# Altium integrated library CbyP.IntLib: 1144 symbols (part 4 of 6) (continued)
## MOC3063S-TA1
designator MOC?
1000V/us 1A 20mA 600V 1.4V SMD-6P Triac, SCR Output Optoisolators RoHS; Manufacturer: LITEON; Mfr.Part #: MOC3063S-TA1; Package: SMD-6P; LCSC Part #: C77950; DigiKey Part Number: 160-1723-2-ND; ComponentLink1Description: Link; ComponentLink1URL: https://www.lcsc.com/product-detail/C77950.html?s_z=n_moc3063; ComponentLink2Description: Link 1; ComponentLink2URL: https://www.digikey.com/en/products/detail/liteon/MOC3063S-TA1/670015
footprint SMD-6P
pins: 1 ANODE, 2 CATHODE, 4 MAIN_TERMINAL1, 6 MAIN_TERMINAL2
text: ZERO

## MOC3063SM
designator MOC?
600V/us 100mA 60mA 1.3V 600V SMD-6P Triac, SCR Output Optoisolators RoHS; Manufacturer: onsemi; Mfr.Part #: MOC3063SM; Package: SMD-6P; LCSC Part #: C899841; DigiKey Part Number: MOC3063SM-ND; ComponentLink1Description: Link; ComponentLink1URL: https://www.lcsc.com/product-detail/C899841.html?s_z=n_MOC3063; ComponentLink2Description: Link 1; ComponentLink2URL: https://www.digikey.com/en/products/detail/onsemi/MOC3063SM/401990
footprint SMD-6P
pins: 1 ANODE, 2 CATHODE, 4 MAIN_TERMINAL1, 6 MAIN_TERMINAL2
text: ZERO

## MS2A40LWS
designator D?, comment JU4
DIODE SCHOTTKY 40V SOD-323; Manufacturer: MSKSEMI; Mfr.Part #: MS2A40LWS; Package: SOD-323; LCSC Part #: C7380001
footprint SOD-323
pins: 1 A, 2 K

## NFMW486AM-V2
designator LED?, comment WHITE
5050 replacement pkg, High efficiency and high flux; Manufacturer: NICHIA; Mfr.Part #: NFMW486AM-V2; Package: SMD,5.8x6.5x0.8mm; LCSC Part #: NO; DigiKey Part Number: NO; ComponentLink1Description: Link; ComponentLink1URL: https://led-ld.nichia.co.jp/en/product/led_product_data.html?type=NFMW486AM-V2+%28Ra+Typ.70%29&kbn=0
footprint NFMW486AM-V2
pins: 1 A, 2 K

## NVD5117PLT4G-VF01
designator Q?, comment NVD5117PL
60V 61A 16mΩ@10V,61A 118W 1.5V 1 piece P-channel DPAK MOSFETs ROHS; Manufacturer: onsemi; Mfr.Part #: NVD5117PLT4G-VF01; Package: DPAK; LCSC Part #: C604532
footprint TO-252
pins: 1 G, 2 D, 3 S

## PC357A
designator Q?
OPTOISOLATOR 3.75kV 1CH TRANS SOP-4-208mil-2.54mm; Manufacturer: AOTE; Package: SOP-4-2.54mm; Mfr.Part #: PC357A; LCSC Part #: C22384609
footprint SOP-4-2.54mm
pins: 1 A, 2 K, 3 E, 4 C

## PC817C
designator Q?, comment PC817
Phototransistor Output 5kVrms 1 Channel SMD-4P; Manufacturer: GOODWORK; Mfr.Part #: PC817C; LCSC Part #: C3025164; Package: SMD-4P; DigiKey Part Number: NO; ComponentLink1Description: Link; ComponentLink1URL: https://www.lcsc.com/product-detail/C3025164.html?s_z=n_C3025164; ComponentLink2Description: Link 1
footprint SOP-4
pins: 1 A, 2 K, 3 E, 4 C

## PC817C-S
designator Q?, comment PC817
Phototransistor Output 5kVrms 1 Channel SOP-4-2.54mm; Manufacturer: UMW; Mfr.Part #: PC817C-S; Package: SOP-4-2.54mm; LCSC Part #: C3008369; DigiKey Part Number: NO; ComponentLink1Description: Link; ComponentLink1URL: https://www.lcsc.com/product-detail/C3008369.html?s_z=n_C3008369; ComponentLink2Description: Link 1
footprint SOP-4
pins: 1 A, 2 K, 3 E, 4 C

## PESD3V3L5UY,115
designator ESD?, comment ESD3.3V
12VC Clamp 2.5A@8/20us Ipp ESD DIODE SOT-363; Manufacturer: Nexperia; Mfr.Part #: PESD3V3L5UY,115; So_Chan_Cam: 0; Package: SOT-363; LCSC Part #: C477992; DigiKey Part Number: 1727-3828-2-ND; ComponentLink1Description: Link; ComponentLink1URL: https://www.lcsc.com/product-detail/C477992.html?s_z=n_PESD3V3L5UY%252C115; ComponentLink2Description: Link 1; ComponentLink2URL: https://www.digikey.com/en/products/detail/nexperia-usa-inc/PESD3V3L5UY-115/1157444?s=N4IgTCBcDaIAoFEDKARAzANTQGQKwFUBNAGgEZTcQBdAXyA
footprint SOT-363
pins: 1 C, 2 A, 3 C, 4 C, 5 C, 6 C

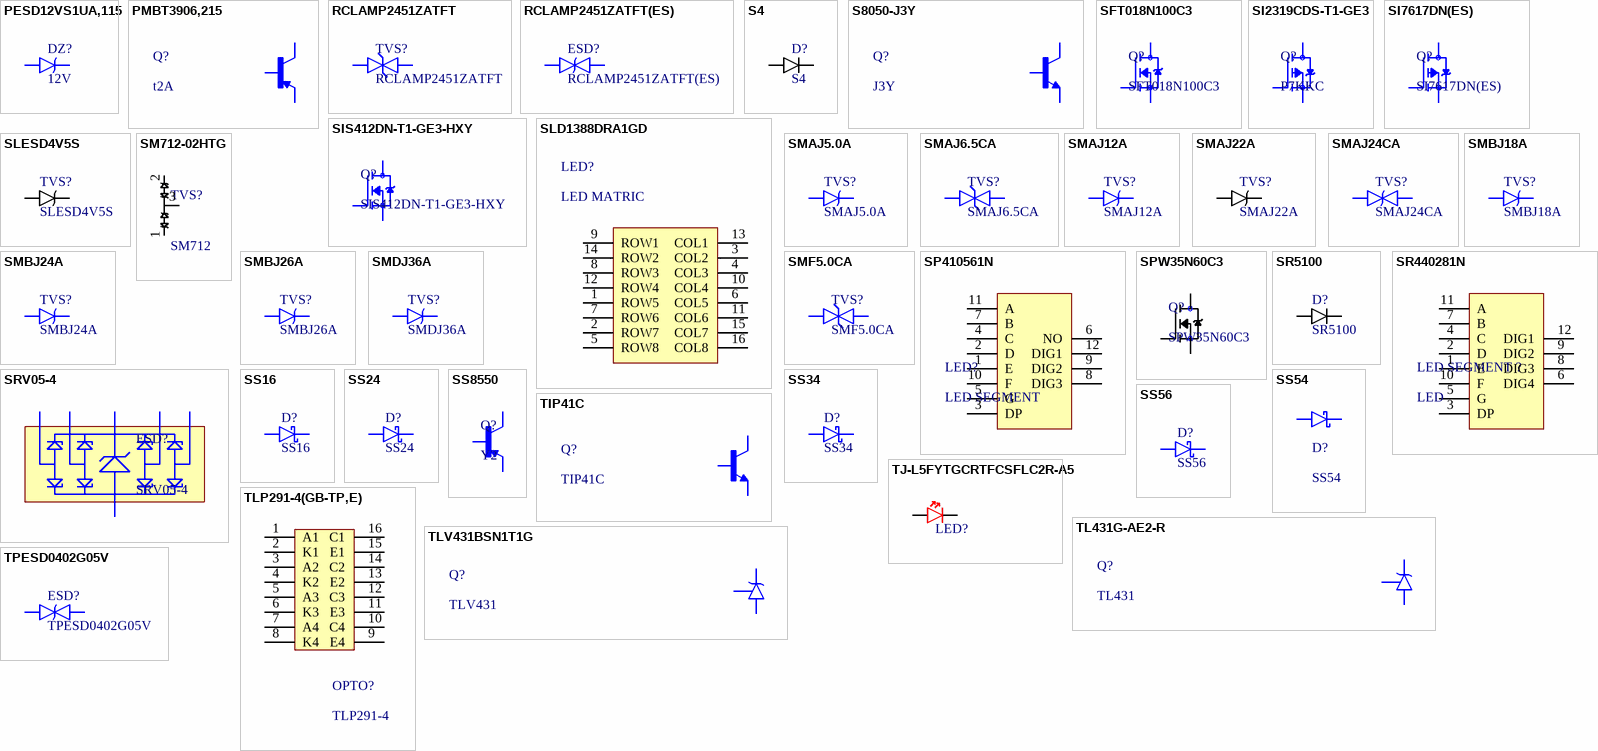
[diagram p21: symbols PESD12VS1UA,115 to TPESD0402G05V]

## PESD12VS1UA,115
designator DZ?, comment 12V
ESD DIODE 12VWM 27VC SOD-323; Manufacturer: Nexperia; Mfr.Part #: PESD12VS1UA,115; Package: SOD-323; LCSC Part #: C131084
footprint SOD-323
pins: 1 A, 2 K

## PMBT3906,215
designator Q?, comment t2A
Bipolar (BJT) Transistor PNP 40V 200mA 250MHz 250mW Surface Mount SOT-23; Manufacturer: Nexperia; Mfr.Part #: PMBT3906,215; LCSC Part #: C8670; Package: SOT-23; DigiKey Part Number: 1727-2960-2-ND; ComponentLink1Description: Link; ComponentLink1URL: https://www.lcsc.com/product-detail/C8670.html?s_z=n_PMBT3906; ComponentLink2Description: Link 1; ComponentLink2URL: https://www.digikey.com/en/products/detail/nexperia-usa-inc/PMBT3906-215/763346
footprint SOT-23
pins: 1 B, 2 E, 3 C

## RCLAMP2451ZATFT
designator TVS?
TVS DIODE 24VWM 8VC 0201; Manufacturer: SEMTECH; Mfr.Part #: RCLAMP2451ZATFT; Package: 0201; LCSC Part #: C1975086
footprint SOD-123
pins: 1, 2

## RCLAMP2451ZATFT(ES)
designator ESD?
ESD DIODE 24VWM 5.6VC DFN0603-2L; Manufacturer: ElecSuper; Mfr.Part #: RCLAMP2451ZATFT(ES); Package: DFN0603-2L; LCSC Part #: C42400636
footprint DFN0603-2L
pins: 1 A, 2 K

## S4
designator D?
40V Single 350mA 600mV@200mA SOD-123 Schottky Barrier Diodes (SBD) ROHS; Manufacturer: HXY MOSFET; Mfr.Part #: 1N5819W; So_Chan_Dan: 2; So_Chan_Cam: 0; Package: SOD-123; Name: 1N5819W
footprint SOD-123
pins: 1 A, 2 K

## S8050-J3Y
designator Q?, comment J3Y
Bipolar (BJT) Transistor NPN 25V 300mA 150MHz 300mW Surface Mount SOT-23; Manufacturer: JSMSEMI; Mfr.Part #: S8050-J3Y; LCSC Part #: C18221467; Package: SOT-23; DigiKey Part Number: NO
footprint SOT-23
pins: 1 B, 2 E, 3 C

## SFT018N100C3
designator Q?
N-Channel 100V 320A 312W Surface Mount TOLL; Manufacturer: SCILICON; Package: TOLL; Mfr.Part #: SFT018N100C3; LCSC Part #: C42395330; DigiKey Part Number: NO; ComponentLink1Description: Link; ComponentLink1URL: https://www.lcsc.com/product-detail/C42395330.html?s_z=n_c42395330; ComponentLink2Description: Link 1
footprint TOLL
pins: 1 G, 2 S, 3 D

## SI2319CDS-T1-GE3
designator Q?, comment P7KKC
P-Channel 40V 4.4A 2.5W Surface Mount SOT-23; Manufacturer: VISHAY; Mfr.Part #: SI2319CDS-T1-GE3; Package: SOT-23; LCSC Part #: C146287; DigiKey Part Number: SI2319CDS-T1-GE3TR-ND; ComponentLink1Description: Link; ComponentLink1URL: https://www.lcsc.com/product-detail/C146287.html?s_z=n_Si2319; ComponentLink2Description: Link 1; ComponentLink2URL: https://www.digikey.com/en/products/detail/vishay-siliconix/SI2319CDS-T1-GE3/2441585?s=N4IgTCBcDaIMoEkwGYCMBOAwgETgWgBVU8BxAUWRAF0BfIA
footprint SOT-23
pins: 1 G, 2 S, 3 D

## SI7617DN(ES)
designator Q?
MOSFET P-CH 30V 39A PDFN-8L(3x3); Manufacturer: ElecSuper; Package: PDFN-8L(3x3); Mfr.Part #: SI7617DN(ES); LCSC Part #: C42412335
footprint PDFN-8L(3x3)
pins: 1 G, 2 S, 3 S, 4 S, 5 D, 6 D, 7 D, 8 D, 9 D

## SIS412DN-T1-GE3-HXY
designator Q?
MOSFET N-CH 30V 20A DFN-8L(3x3); Manufacturer: HXY MOSFET; Package: DFN-8L(3x3); Mfr.Part #: SIS412DN-T1-GE3-HXY; LCSC Part #: C22366922
footprint PDFN-8L(3x3)
pins: 1 S, 2 S, 3 S, 4 G, 5 D, 6 D, 7 D, 8 D, 9 D

## SLD1388DRA1GD
designator LED?, comment LED MATRIC
Common Anode 8x8 Red Plugin LED Dot Matrix and Cluster ROHS; Manufacturer: SUNLIGHT; Mfr.Part #: SLD1388DRA1GD; Package: Through Hole; LCSC Part #: C2913075; DigiKey Part Number: NO
footprint LED MATRIX 8X8DOT 32X32MM
pins: 1 ROW5, 2 ROW7, 3 COL2, 4 COL3, 5 ROW8, 6 COL5, 7 ROW6, 8 ROW3, 9 ROW1, 10 COL4, 11 COL6, 12 ROW4, 13 COL1, 14 ROW2, 15 COL7, 16 COL8

## SLESD4V5S
designator TVS?
1.26kW 5V Unidirectional 4.5V SOD-323 ESD and Surge Protection (TVS/ESD) ROHS; Manufacturer: Slkor(SLKORMICRO Elec.); So_Chan_Dan: 2; So_Chan_Cam: 0; Mfr.Part #: SLESD4V5S; Package: SOD-323; Name: SLESD4V5S
footprint SOD-323
pins: 1 A, 2 K

## SM712-02HTG
designator TVS?, comment SM712
19A@8/20us 600W@8/20us Bidirectional SOT-23 ESD and Surge Protection (TVS/ESD) ROHS; Manufacturer: Littelfuse; Mfr.Part #: SM712-02HTG; Package: SOT-23; LCSC Part #: C172881
footprint SOT-23
pins: 1 C, 2, 3 A

## SMAJ5.0A
designator TVS?
TVS DIODE 5VWM 9.2VC DO-214AC(SMA); Manufacturer: Littelfuse; Mfr.Part #: SMAJ5.0A; Package: DO-214AC(SMA); LCSC Part #: C83329
footprint SMA(DO-214AC) - 2
pins: 1 A, 2 K

## SMAJ6.5CA
designator TVS?
35.7A 400W 11.2V 7.22V 6.5V SMA(DO-214AC) ESD and Surge Protection (TVS/ESD) ROHS; Manufacturer: GOODWORK; Mfr.Part #: SMAJ6.5CA; Package: SMA(DO-214AC); LCSC Part #: C908811; DigiKey Part Number: NO
footprint SMA(DO-214AC)-1
pins: 1, 2

## SMAJ12A
designator TVS?
TVS DIODE 12VWM 19.9VC DO-214AC(SMA); Manufacturer: GOODWORK; Mfr.Part #: SMAJ12A; Package: DO-214AC(SMA); LCSC Part #: C908766
footprint SMA(DO-214AC) - 2
pins: 1 A, 2 K

## SMAJ22A
designator TVS?
11.3A 35.5V 400W 24.4V Unidirectional 22V SMA ESD and Surge Protection (TVS/ESD) ROHS; Manufacturer: PAKER; So_Chan_Dan: 2; So_Chan_Cam: 0; Mfr.Part #: SMAJ22A; Package: SMA; Name: SMAJ22A
footprint SMA(DO-214AC)
pins: 1 A, 2 K

## SMAJ24CA
designator TVS?
10.3A 400W@10/1000us 38.9V 29.5V Bidirectional 24V DO-214AC(SMA) TVS Diodes RoHS; Manufacturer: Littelfuse; Mfr.Part #: SMAJ24CA; Package: SMA(DO-214AC); LCSC Part #: C148223; DigiKey Part Number: SMAJ24CALFTR-ND
footprint SMA(DO-214AC)
footprint SMA(DO-214AC)-1
pins: 1 A, 2 K

## SMBJ18A
designator TVS?
TVS DIODE 18VWM 29.2VC DO-214AA; Manufacturer: Littelfuse; Mfr.Part #: SMBJ18A; Package: DO-214AA; LCSC Part #: C151256
footprint SMB(DO-214AA)
footprint SMB(DO-214AA) - 1
pins: 1 A, 2 K

## SMBJ24A
designator TVS?
TVS DIODE 24VWM 38.9VC DO-214AA(SMB); Manufacturer: GOODWORK; Mfr.Part #: SMBJ24A; Package: DO-214AA(SMB); LCSC Part #: C908801
footprint SMB(DO-214AA)
footprint SMB(DO-214AA) - 1
pins: 1 A, 2 K

## SMBJ26A
designator TVS?
TVS DIODE 26VWM 42.1VC DO-214AA; Manufacturer: Littelfuse; Mfr.Part #: SMBJ26A; Package: DO-214AA; LCSC Part #: C315992
footprint SMB(DO-214AA)
pins: 1 A, 2 K

## SMDJ36A
designator TVS?
51.6A 58.1V 3kW 40V Unidirectional 36V SMC ESD and Surge Protection (TVS/ESD) ROHS; Manufacturer: SETsafe | SETfuse; Mfr.Part #: SMDJ36A; Package: SMC; Name: SMDJ36A
footprint SMC
pins: 1 A, 2 K

## SMF5.0CA
designator TVS?
TVS DIODE 5VWM 9.2VC SOD-123FL; Manufacturer: JSMSEMI; Mfr.Part #: SMF5.0CA; Package: SOD-123FL; LCSC Part #: C2857315; DigiKey Part Number: NO
footprint SOD-123
pins: 1, 2

## SP410561N
designator LED?, comment LED SEGMENT
Display Modules - LED Character and Numeric Red 3 Character Common Anode Through Hole; Manufacturer: ARKLED; Mfr.Part #: SP410561N; Package: Through Hole; LCSC Part #: C98924; DigiKey Part Number: NO; ComponentLink1Description: Link; ComponentLink1URL: https://www.lcsc.com/product-detail/C98924.html?s_z=n_q_C98924&globalKeyword=C98924; ComponentLink2Description: Link
footprint LED SEGMENT 3 POSITIONS 0.56INCH
pins: 1 E, 2 D, 3 DP, 4 C, 5 G, 6 NO, 7 B, 8 DIG3, 9 DIG2, 10 F, 11 A, 12 DIG1

## SPW35N60C3
designator Q?
TO-247AC-3 MOSFETs ROHS; Manufacturer: Infineon Technologies; So_Chan_Dan: 0; So_Chan_Cam: 3; Package: TO-247AC-3; Mfr.Part #: SPW35N60C3; Name: SPW35N60C3
footprint TO-247-3
pins: 1 G, 2 D, 3 S

## SR5100
designator D?
100V 850mV@5A 5A DO-201AD Schottky Diodes ROHS; Manufacturer: MDD(Microdiode Semiconductor); So_Chan_Dan: 0; So_Chan_Cam: 2; Mfr.Part #: SR5100; Package: DO-201AD; Name: SR5100
footprint DO-201AD
pins: 1 A, 2 K

## SR440281N
designator LED SEGMENT ?, comment LED
Red 4Bit Common Cathode 0.28 Plugin LED Segment Displays ROHS; Manufacturer: ARKLED(Wuxi ARK Tech Elec); Mfr.Part #: SR440281N; Package: Plugin
footprint LED SEGMENT 4 POSITIONS 0.28INCH
footprint LED SEGMENT 4 POSITIONS 0.28INCH-1
pins: 1 E, 2 D, 3 DP, 4 C, 5 G, 6 DIG4, 7 B, 8 DIG3, 9 DIG2, 10 F, 11 A, 12 DIG1

## SRV05-4
designator ESD?
12VC Clamp 4.5A@8/20us Ipp ESD DIODE SOT-23-6; Manufacturer: MSKSEMI; So_Chan_Cam: 0; Mfr.Part #: SRV05-4; Package: SOT-23-6; LCSC Part #: C2836319; DigiKey Part Number: NO; ComponentLink1Description: Link; ComponentLink1URL: https://www.lcsc.com/product-detail/C2836319.html?s_z=n_SRV05-4; ComponentLink2Description: Link 1
footprint SOT23-6
pins: 1 C, 2 A, 3 C, 4 C, 5 C, 6 C

## SS16
designator D?
Diode Independent 60V 1A Surface Mount SMA(DO-214AC); Manufacturer: GOODWORK; Mfr.Part #: SS16; Package: SMA(DO-214AC); LCSC Part #: C2943739
footprint SMA(DO-214AC)
pins: 1 A, 2 K

## SS24
designator D?
40V 1 Independent 550mV@2A 2A SOD-123FL Single Diodes RoHS; Manufacturer: luJing; Mfr.Part #: SS24; Package: SOD-123FL; LCSC Part #: C53058725
footprint SOD-123
pins: 1 A, 2 K

## SS34
designator D?
Diode Independent 40V 3A Surface Mount SMA(DO-214AC); Manufacturer: GOODWORK; Mfr.Part #: SS34; Package: SMA(DO-214AC); LCSC Part #: C908680; DigiKey Part Number: NO; ComponentLink1Description: Link; ComponentLink1URL: https://www.lcsc.com/product-detail/C908680.html?s_z=n_C908680
footprint SMA(DO-214AC)
footprint SMA(DO-214AC) - 2
pins: 1 A, 2 K

## SS54
designator D?
Diode 40V 5A Surface Mount SMA; Manufacturer: JSMSEMI; Mfr.Part #: SS54; Package: SMA; LCSC Part #: C20609300; DigiKey Part Number: NO; ComponentLink1Description: Link; ComponentLink1URL: https://www.lcsc.com/product-detail/C20609300.html?s_z=n_C20609300
footprint SMA(DO-214AC)
footprint SMA(DO-214AC) - 2
pins: 1 A, 2 K

## SS56
designator D?
DIODE SCHOTTKY 60V SMA(DO-214AC); Manufacturer: MDD(Microdiode Semiconductor); Mfr.Part #: SS56; Package: SMA(DO-214AC); LCSC Part #: C65009
footprint SMA(DO-214AC) - 2
pins: 1 A, 2 K

## SS8550
designator Q?, comment Y2
Bipolar (BJT) Transistor PNP 25V 1.5A 100MHz 300mW Surface Mount SOT-23; Manufacturer: JSCJ; Mfr.Part #: SS8550 Y2(RANGE:200-350); LCSC Part #: C8542; DigiKey Part Number: NO; Package: SOT-23; ComponentLink1Description: Link; ComponentLink1URL: https://www.lcsc.com/product-detail/C8542.html?s_z=n_SS8550%2520Y2%28RANGE%253A200-350%29; ComponentLink2Description: Link 1
footprint SOT-23
pins: 1 B, 2 E, 3 C

## TIP41C
designator Q?
TRANS NPN 100V 6A TO-220; Manufacturer: ST; Mfr.Part #: TIP41C; LCSC Part #: C92603; Package: TO-220
footprint TO-220
pins: 1 B, 2 C, 3 E

## TJ-L5FYTGCRTFCSFLC2R-A5
designator LED?, comment RED  (value not drawn)
LED RED WATER CLEAR TH; Manufacturer: TOGIALED; Mfr.Part #: TJ-L5FYTGCRTFCSFLC2R-A5; Package: Through Hole,D=5mm; LCSC Part #: C331032
footprint LED-5MM-RED
pins: 1 A, 2 K

## TL431G-AE2-R
designator Q?, comment TL431
Programmable Precision Reference Linear Integrated Circuit; Manufacturer: UTC; Mfr.Part #: TL431G-AE2-R; LCSC Part #: C71129; Package: SOT-23
footprint SOT-23
pins: 1 R, 2 K, 3 A

## TLP291-4(GB-TP,E)
designator OPTO?, comment TLP291-4
50mA 400mV@2.4mA,8mA 80V 5V 1.2V DC SOP-16-4.4mm Transistor, Photovoltaic Output Optoisolators RoHS; Manufacturer: TOSHIBA; Mfr.Part #: TLP291-4(GB-TP,E); Package: SOP-16-4.4mm; LCSC Part #: C60900; DigiKey Part Number: TLP291-4(GB-TPE)TR-ND; ComponentLink1Description: Link; ComponentLink1URL: https://www.lcsc.com/product-detail/C60900.html; ComponentLink2Description: Link 1; ComponentLink2URL: https://www.digikey.com/en/products/detail/toshiba-semiconductor-and-storage/TLP291-4-GB-TP-E/4562881?s=N4IgTCBcDaICoBkAKYCcBGAtAFgBQHEAhTOJAGgFEBKEAXQF8g
footprint SOP-16-4.4mm
pins: 1 A1, 2 K1, 3 A2, 4 K2, 5 A3, 6 K3, 7 A4, 8 K4, 9 E4, 10 C4, 11 E3, 12 C3, 13 E2, 14 C2, 15 E1, 16 C1

## TLV431BSN1T1G
designator Q?, comment TLV431
Low Voltage Precision Adjustable Shunt Regulator; Manufacturer: onsemi; Mfr.Part #: TLV431BSN1T1G; LCSC Part #: C91075; Package: SOT-23
footprint SOT-23
pins: 1 R, 2 K, 3 A

## TPESD0402G05V
designator ESD?
5VWM 40VC 0402; Manufacturer: TECH PUBLIC; Mfr.Part #: TPESD0402G05V; Package: 0402; LCSC Part #: C558615; DigiKey Part Number: NO; ComponentLink1Description: Link; ComponentLink1URL: https://www.lcsc.com/product-detail/C558615.html?s_z=n_GESD1005H5R5CR10GPT&spm=wm.ssy.bg.0.xh&lcsc_vid=QwdcUVxUFAdbVwUFRQBWBVECTlNYX1QAQFddU1EFQ1kxVlNRQ1NfVlJXQVdeUTsOAxUeFF5JWBYZEEoKFBINSQcJGk4dAgUUFAk%3D; ComponentLink2Description: Link 1
footprint 0402
pins: 1 A, 2 K

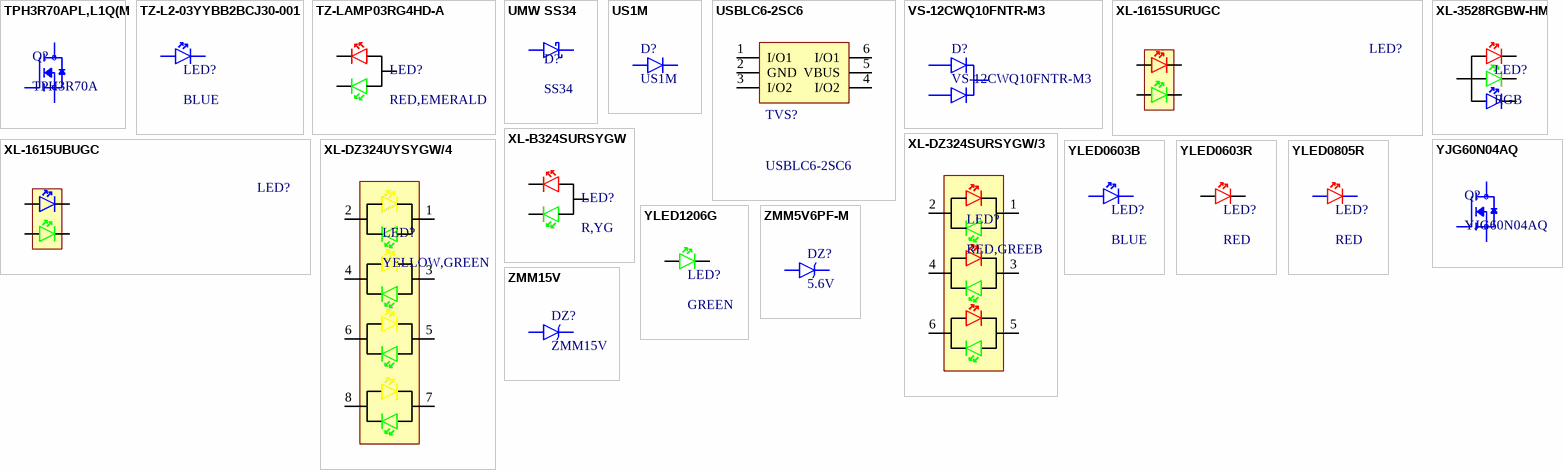
[diagram p22: symbols TPH3R70APL,L1Q(M to ZMM15V]

## TPH3R70APL,L1Q(M
designator Q?, comment TPH3R70A
N-Channel 100V 90A 170W SOP-8-Advance; Manufacturer: TOSHIBA; Mfr.Part #: TPH3R70APL,L1Q(M; Package: PDFN5060-8L; LCSC Part #: C471285; DigiKey Part Number: 264-TPH3R70APLL1QTR-ND; ComponentLink1Description: Link; ComponentLink1URL: https://www.lcsc.com/product-detail/C20605803.html?s_z=n_YJG60N04AQ; ComponentLink2Description: Link 1; ComponentLink2URL: 264-TPH3R70APLL1QTR-ND
footprint PDFN5060-8L-1.1MM
pins: 1 S, 2 S, 3 S, 4 G, 5_8 D

## TZ-L2-03YYBB2BCJ30-001
designator LED?, comment BLUE
20mA 2000mcd 460nm~465nm Blue 2.8V~3.4V 3mm Round Lens 90mW Through Hole,D=3mm LED Indication - Discrete RoHS; Manufacturer: TUOZHAN; Mfr.Part #: TZ-L2-03YYBB2BCJ30-001; Package: Through Hole,D=3mm; LCSC Part #: C779435; DigiKey Part Number: NO
footprint LED-3MM-BLUE
pins: 1 A, 2 K

## TZ-LAMP03RG4HD-A
designator LED?, comment RED,EMERALD
20mA Red, Emerald Green 3mm Round Lens Through Hole,D=3mm LED Indication - Discrete RoHS; Manufacturer: TUOZHAN; Mfr.Part #: TZ-LAMP03RG4HD-A; Package: Through Hole,D=3mm; LCSC Part #: C779416; DigiKey Part Number: NO
footprint LED-3MM-A
pins: 1 R, 2 A, 3 G

## UMW SS34
designator D?, comment SS34
40V 500mV@3A 3A SMA(DO-214AC) Schottky Diodes ROHS; Manufacturer: UMW(Youtai Semiconductor Co., Ltd.); Mfr.Part #: SS34; Package: SMA(DO-214AC); LCSC Part #: C2758579
footprint SMA(DO-214AC)
pins: 1 A, 2 K

## US1M
designator D?
Diode 1kV 1A SMA; Manufacturer: MDD(Microdiode Semiconductor); Mfr.Part #: US1M; Package: DO-214AC(SMA); LCSC Part #: C412437
footprint SMA(DO-214AC)
footprint SMA(DO-214AC) - 2
pins: 1 A, 2 K

## USBLC6-2SC6
designator TVS?
6A 15V 150W 9V 5V SOT-23-6 TVS Diodes RoHS; Manufacturer: TWGMC; Mfr.Part #: USBLC6-2SC6; Package: SOT-23-6; LCSC Part #: C5250994; DigiKey Part Number: NO
footprint SOT23-6
pins: 1 I/O1, 2 GND, 3 I/O2, 4 I/O2, 5 VBUS, 6 I/O1

## VS-12CWQ10FNTR-M3
designator D?
Diode Array 1 Pair Common Cathode 100V 6A Surface Mount DPAK(TO-252AA); Manufacturer: VISHAY; Mfr.Part #: VS-12CWQ10FNTR-M3; Package: DPAK(TO-252AA); LCSC Part #: C241867; DigiKey Part Number: VS-12CWQ10FNTR-M3TR-ND; ComponentLink1Description: Link; ComponentLink1URL: https://www.lcsc.com/product-detail/C241867.html?s_z=n_12CWQ10FN; ComponentLink2Description: Link 1; ComponentLink2URL: https://www.digikey.com/en/products/detail/vishay-general-semiconductor-diodes-division/VS-12CWQ10FNTR-M3/4933563?s=N4IgTCBcDaIGoGUC0BGMBhA6gRRQBgDEA5AFQCUkBZAZhAF0BfIA
footprint TO-252
pins: 1 A, 2 K, 3 A

## XL-1615SURUGC
designator LED?, comment R,EG  (value not drawn)
Red, Emerald Green 625nm 525nm LED Indication - Discrete 2.4V 3.4V SMD-4P,1.6x1.5mm; Manufacturer: XINGLIGHT; Mfr.Part #: XL-1615SURUGC; Package: SMD-4P,1.6x1.5mm; LCSC Part #: C965839; DigiKey Part Number: 5962-XL-1615SURUGCTR-ND; ComponentLink1Description: Link; ComponentLink1URL: https://www.lcsc.com/product-detail/C965839.html?s_z=n_C965839; ComponentLink2Description: Link 1; ComponentLink2URL: https://www.digikey.com/en/products/detail/xinglight/XL-1615SURUGC/25672997?s=N4IgTCBcDaIBoBkC0BGAbCgrAZQKoCVcBxAYRAF0BfIA
footprint SMD-4P,1.6x1.5mm
pins: 1 R, 2 G, 3 A2, 4 A1

## XL-1615UBUGC
designator LED?, comment BLUE,GREEN  (value not drawn)
20mA Colorless Transparent Lens -20℃~+85℃ Positive Stick Common Anode Emerald,Blue 70mW 3.4V 0606 LED Indication - Discrete ROHS; Manufacturer: XINGLIGHT; Mfr.Part #: XL-1615UBUGC; Package: 0606; LCSC Part #: C965835; DigiKey Part Number: 5962-XL-1615UBUGCTR-ND
footprint 0606
pins: 1 B, 2 G, 3 A2, 4 A1

## XL-3528RGBW-HM
designator LED?, comment RGB
3528 multicolor foggy common-anode SMD light-emitting diodes; Manufacturer: XINGLIGHT; Mfr.Part #: XL-3528RGBW-HM; Package: SMD3528-4P; LCSC Part #: C2843813; DigiKey Part Number: 5962-XL-3528RGBW-HMTR-ND
footprint SMD3528-4P
pins: 1 R, 2 A, 3 G, 4 B

## XL-B324SURSYGW
designator LED?, comment R,YG
Red, Yellow Green 638nm 560nm LED Indication - Discrete 2.4V 2.4V Through Hole,D=3mm; Manufacturer: XINGLIGHT; Mfr.Part #: XL-B324SURSYGW; Package: Through Hole,D=3mm; LCSC Part #: C2895561; DigiKey Part Number: 5962-XL-B324SURSYGW-ND
footprint LED-3MM-A
pins: 1 R, 2 A, 3 G

## XL-DZ324SURSYGW/3
designator LED?, comment RED,GREEB
F3MM White-Emitting, Red and General Green Dual-Color Misty Three-Hole Lamp Holder; Manufacturer: XINGLIGHT; Mfr.Part #: XL-DZ324SURSYGW/3; Package: Through Hole,P=2.54mm; LCSC Part #: C33962455
footprint Through Hole,P=2.54mm,LED
pins: 1, 2, 3, 4, 5, 6

## XL-DZ324UYSYGW/4
designator LED?, comment YELLOW,GREEN
F3MM White with Yellow and General Green Bicolor Foggy Four-hole Lamp Socket; Manufacturer: XINGLIGHT; Mfr.Part #: XL-DZ324UYSYGW/4; Package: Through Hole,P=1.9mm; LCSC Part #: C33962458
footprint Through Hole,P=2.54mm,4-LED
pins: 1, 2, 3, 4, 5, 6, 7, 8

## YJG60N04AQ
designator Q?
N-Channel 40V 60A 50W Surface Mount PDFN5060-8L; Manufacturer: YANGJIE; Package: PDFN5060-8L; Mfr.Part #: YJG60N04AQ; LCSC Part #: C20605803; DigiKey Part Number: NO; ComponentLink1Description: Link; ComponentLink1URL: https://www.lcsc.com/product-detail/C20605803.html?s_z=n_YJG60N04AQ
footprint PDFN5060-8L-1.1MM
pins: 1 S, 2 S, 3 S, 4 G, 5_8 D

## YLED0603B
designator LED?, comment BLUE
30mA 42mcd~86mcd 460nm~475nm Blue 2.6V~3.2V 0603 LED Indication - Discrete ROHS; Manufacturer: YONGYUTAI; Mfr.Part #: YLED0603B; Package: 0603; LCSC Part #: C19171394; DigiKey Part Number: NO
footprint LED-0603
pins: 1 A, 2 K

## YLED0603R
designator LED?, comment RED
25mA 1.8V~2.4V Red 0603 LED Indication - Discrete ROHS; Manufacturer: YONGYUTAI; Mfr.Part #: YLED0603R; Package: 0603; LCSC Part #: C19171390; DigiKey Part Number: NO; ComponentLink1Description: Link; ComponentLink1URL: https://www.lcsc.com/product-detail/C19171390.html?s_z=n_C19171390; ComponentLink2Description: Link 1
footprint LED-0603
pins: 1 A, 2 K

## YLED0805R
designator LED?, comment RED
Red 645nm LED Indication - Discrete 1.8V~2.4V 0805; Manufacturer: YONGYUTAI; Mfr.Part #: YLED0805R; Package: 0805; LCSC Part #: C19171391; DigiKey Part Number: NO; ComponentLink1Description: Link; ComponentLink1URL: https://www.lcsc.com/product-detail/C19171391.html?s_z=n_LED
footprint LED-0805
pins: 1 A, 2 K

## YLED1206G
designator LED?, comment GREEN
Emerald Green 525nm LED Indication - Discrete 2.4V~3.1V 1206; Manufacturer: YONGYUTAI; Mfr.Part #: YLED1206G; Package: 1206; LCSC Part #: C30584801; DigiKey Part Number: NO
footprint LED-GREEN-1206
pins: 1 A, 2 K

## ZMM5V6PF-M
designator DZ?, comment 5.6V
Zener Diode 5.6V 500mW Surface Mount LL-34; Manufacturer: ST(Semtech); Mfr.Part #: ZMM5V6PF-M; Package: LL-34; LCSC Part #: C7497481; DigiKey Part Number: NO; ComponentLink1Description: Link; ComponentLink1URL: https://www.lcsc.com/product-detail/C7497481.html?s_z=n_ZMM5V6&spm=wm.ssy.bg.3.xh&lcsc_vid=QVhYA1deElkMBVEAQVVWVAECEVVXUAcCTgNYUQVSEVAxVlNRQ1VaXl1WTlFdUTsOAxUeFF5JWBYZEEoKFBINSQcJGk4dAgUUFAk%3D; ComponentLink2Description: Link 1; ComponentLink2URL: *
footprint LL-34
pins: 1 A, 2 K

## ZMM15V
designator DZ?
Zener Diode Independent 15V 500mW Surface Mount LL-34; Manufacturer: HXY MOSFET; Mfr.Part #: ZMM15V; Package: LL-34; LCSC Part #: C5346000; DigiKey Part Number: NO; ComponentLink1Description: Link; ComponentLink1URL: https://www.lcsc.com/product-detail/C5346000.html?s_z=n_ZMM15V
footprint LL-34
pins: 1 A, 2 K

